# Altium integrated library LEMO Unipole And Multipole Type Connectors.IntLib: 1566 symbols (part 7 of 13) (continued)
## PKA.M0.4GL.VB
designator J?
Fixed receptacle with two nuts (back panel mounting), 90° print contacts, Key (A), P series, Multipole Type with 4 Contacts; Manufacturer: LEMO; PartNumber: PKA.M0.4GL.VB; Number of contacts: 4; Contact Diameter: 0.9 mm; Test voltage (kV rms) Contact-Contact: 1.2; Rated Current(A): 8; DatasheetVersion: Jun-14; PackageReference: PKA.M0.4GL.VB; PackageDescription: Fixed receptacle with two nuts (back panel mounting), 90° print contacts, Key(A) for Printed Circuit; ComponentLink1Description: Manufacturer URL; ComponentLink1URL: http://www.lemo.com; ComponentLink2Description: Datasheet; ComponentLink2URL: http://intra.lemo.ch/catalog/ROW/UK_English/P_series_catalog.pdf
footprint PKA.M0.4GL.VB (Socket, Female, Height 33.5 mm, Through hole)
pins: 1, 2, 3, 4

## PKA.M0.4GL.VG
designator J?
Fixed receptacle with two nuts (back panel mounting), 90° print contacts, Key (A), P series, Multipole Type with 4 Contacts; Manufacturer: LEMO; PartNumber: PKA.M0.4GL.VG; Number of contacts: 4; Contact Diameter: 0.9 mm; Test voltage (kV rms) Contact-Contact: 1.2; Rated Current(A): 8; DatasheetVersion: Jun-14; PackageReference: PKA.M0.4GL.VG; PackageDescription: Fixed receptacle with two nuts (back panel mounting), 90° print contacts, Key(A) for Printed Circuit; ComponentLink1Description: Manufacturer URL; ComponentLink1URL: http://www.lemo.com; ComponentLink2Description: Datasheet; ComponentLink2URL: http://intra.lemo.ch/catalog/ROW/UK_English/P_series_catalog.pdf
footprint PKA.M0.4GL.VG (Socket, Female, Height 33.5 mm, Through hole)
pins: 1, 2, 3, 4

## PKA.M0.4GL.VJ
designator J?
Fixed receptacle with two nuts (back panel mounting), 90° print contacts, Key (A), P series, Multipole Type with 4 Contacts; Manufacturer: LEMO; PartNumber: PKA.M0.4GL.VJ; Number of contacts: 4; Contact Diameter: 0.9 mm; Test voltage (kV rms) Contact-Contact: 1.2; Rated Current(A): 8; DatasheetVersion: Jun-14; PackageReference: PKA.M0.4GL.VJ; PackageDescription: Fixed receptacle with two nuts (back panel mounting), 90° print contacts, Key(A) for Printed Circuit; ComponentLink1Description: Manufacturer URL; ComponentLink1URL: http://www.lemo.com; ComponentLink2Description: Datasheet; ComponentLink2URL: http://intra.lemo.ch/catalog/ROW/UK_English/P_series_catalog.pdf
footprint PKA.M0.4GL.VJ (Socket, Female, Height 33.5 mm, Through hole)
pins: 1, 2, 3, 4

## PKA.M0.4GL.VN
designator J?
Fixed receptacle with two nuts (back panel mounting), 90° print contacts, Key (A),  series, Multipole Type with 4 Contacts; Manufacturer: LEMO; PartNumber: PKA.M0.4GL.VN; Number of contacts: 4; Contact Diameter: 0.9 mm; Test voltage (kV rms) Contact-Contact: 1.2; Rated Current(A): 8; DatasheetVersion: Jun-14; PackageReference: PKA.M0.4GL.VN; PackageDescription: Fixed receptacle with two nuts (back panel mounting), 90° print contacts, Key(A) for Printed Circuit; ComponentLink1Description: Manufacturer URL; ComponentLink1URL: http://www.lemo.com; ComponentLink2Description: Datasheet; ComponentLink2URL: http://intra.lemo.ch/catalog/ROW/UK_English/P_series_catalog.pdf
footprint PKA.M0.4GL.VN (Socket, Female, Height 33.5 mm, Through hole)
pins: 1, 2, 3, 4

## PKA.M0.4GL.VR
designator J?
Fixed receptacle with two nuts (back panel mounting), 90° print contacts, Key (A), P series, Multipole Type with 4 Contacts; Manufacturer: LEMO; PartNumber: PKA.M0.4GL.VR; Number of contacts: 4; Contact Diameter: 0.9 mm; Test voltage (kV rms) Contact-Contact: 1.2; Rated Current(A): 8; DatasheetVersion: Jun-14; PackageReference: PKA.M0.4GL.VR; PackageDescription: Fixed receptacle with two nuts (back panel mounting), 90° print contacts, Key(A) for Printed Circuit; ComponentLink1Description: Manufacturer URL; ComponentLink1URL: http://www.lemo.com; ComponentLink2Description: Datasheet; ComponentLink2URL: http://intra.lemo.ch/catalog/ROW/UK_English/P_series_catalog.pdf
footprint PKA.M0.4GL.VR (Socket, Female, Height 33.5 mm, Through hole)
pins: 1, 2, 3, 4

## PKA.M0.4GL.VV
designator J?
Fixed receptacle with two nuts (back panel mounting), 90° print contacts, Key (A), P series, Multipole Type with 4 Contacts; Manufacturer: LEMO; PartNumber: PKA.M0.4GL.VV; Number of contacts: 4; Contact Diameter: 0.9 mm; Test voltage (kV rms) Contact-Contact: 1.2; Rated Current(A): 8; DatasheetVersion: Jun-14; PackageReference: PKA.M0.4GL.VV; PackageDescription: Fixed receptacle with two nuts (back panel mounting), 90° print contacts, Key(A) for Printed Circuit; ComponentLink1Description: Manufacturer URL; ComponentLink1URL: http://www.lemo.com; ComponentLink2Description: Datasheet; ComponentLink2URL: http://intra.lemo.ch/catalog/ROW/UK_English/P_series_catalog.pdf
footprint PKA.M0.4GL.VV (Socket, Female, Height 33.5 mm, Through hole)
pins: 1, 2, 3, 4

## PKA.M0.4GL.VZ
designator J?
Fixed receptacle with 1 nut (without 2nd front nut), Key (A), P series, Multipole Type with 4 Contacts; Manufacturer: LEMO; PartNumber: PKA.M0.4GL.VZ; Number of contacts: 4; Contact Diameter: 0.9 mm; Test voltage (kV rms) Contact-Contact: 1.2; Rated Current(A): 8; DatasheetVersion: Jun-14; PackageReference: PKA.M0.4GL.VZ; PackageDescription: Fixed receptacle with 1 nut (without 2nd front nut), Key(A) for Printed Circuit; ComponentLink1Description: Manufacturer URL; ComponentLink1URL: http://www.lemo.com; ComponentLink2Description: Datasheet; ComponentLink2URL: http://intra.lemo.ch/catalog/ROW/UK_English/P_series_catalog.pdf
footprint PKA.M0.4GL.VZ (Socket, Female, Height 33.5 mm, Through hole)
pins: 1, 2, 3, 4

## PKA.M0.4NL.NN
designator J?
Fixed receptacle with two nuts (back panel mounting), straight print contacts, Key (A), P series, Multipole Type with 4 Contacts; Manufacturer: LEMO; PartNumber: PKA.M0.4NL.NN; Number of contacts: 4; Contact Diameter: 0.9 mm; Test voltage (kV rms) Contact-Contact: 1.2; Rated Current(A): 8; DatasheetVersion: Jun-14; PackageReference: PKA.M0.4NL.NN; PackageDescription: Fixed receptacle with two nuts (back panel mounting), straight print contacts, Key(A) for Printed Circuit; ComponentLink1Description: Manufacturer URL; ComponentLink1URL: http://www.lemo.com; ComponentLink2Description: Datasheet; ComponentLink2URL: http://intra.lemo.ch/catalog/ROW/UK_English/P_series_catalog.pdf
footprint PKA.M0.4NL.NN (Socket, Female, Height 33.5 mm, Through hole)
pins: 1, 2, 3, 4

## PKA.M0.4NL.NV
designator J?
Fixed receptacle with two nuts (back panel mounting), straight print contacts, Key (A), P series, Multipole Type with 4 Contacts; Manufacturer: LEMO; PartNumber: PKA.M0.4NL.NV; Number of contacts: 4; Contact Diameter: 0.9 mm; Test voltage (kV rms) Contact-Contact: 1.2; Rated Current(A): 8; DatasheetVersion: Jun-14; PackageReference: PKA.M0.4NL.NV; PackageDescription: Fixed receptacle with two nuts (back panel mounting), straight print contacts, Key(A) for Printed Circuit; ComponentLink1Description: Manufacturer URL; ComponentLink1URL: http://www.lemo.com; ComponentLink2Description: Datasheet; ComponentLink2URL: http://intra.lemo.ch/catalog/ROW/UK_English/P_series_catalog.pdf
footprint PKA.M0.4NL.NV (Socket, Female, Height 33.5 mm, Through hole)
pins: 1, 2, 3, 4

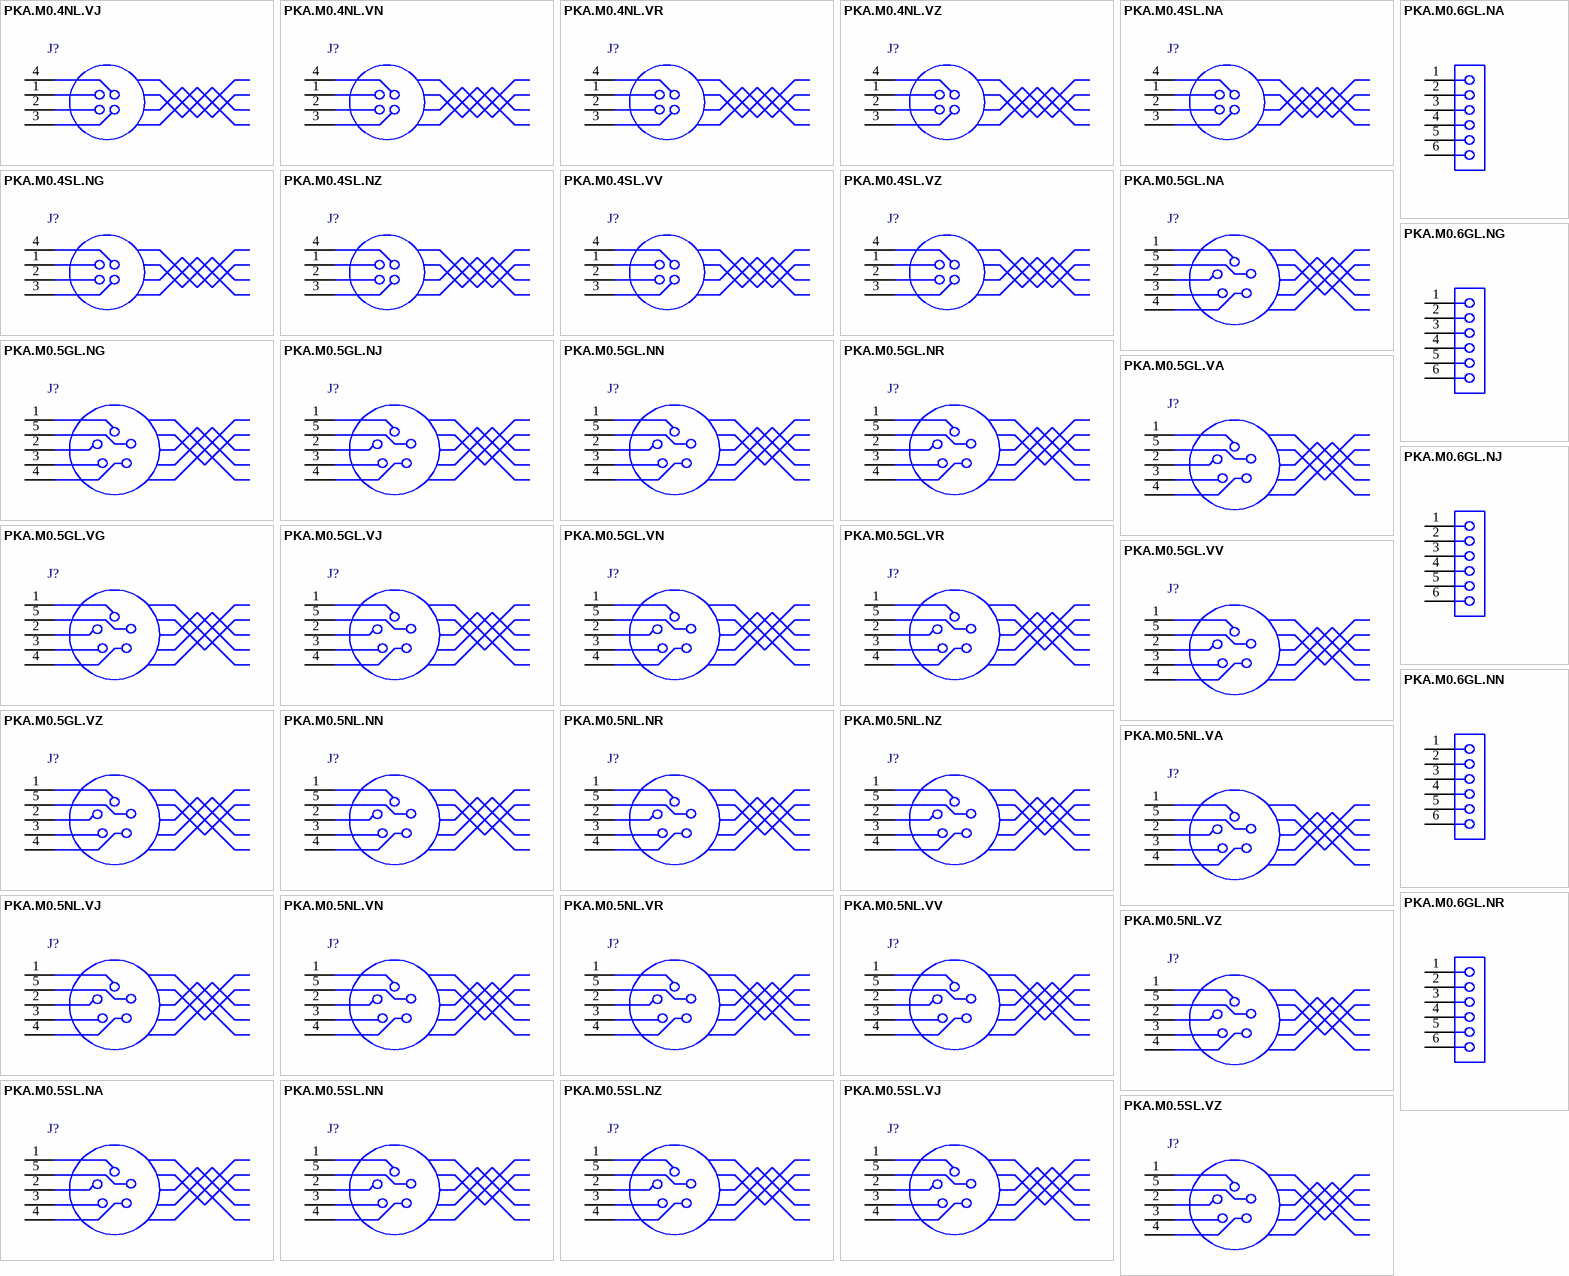
[diagram p24: symbols PKA.M0.4NL.VJ to PKA.M0.6GL.NR]

## PKA.M0.4NL.VJ
designator J?
Fixed receptacle with two nuts (back panel mounting), 90° print contacts, Key (A), P series, Multipole Type with 4 Contacts; Manufacturer: LEMO; PartNumber: PKA.M0.4NL.VJ; Number of contacts: 4; Contact Diameter: 0.9 mm; Test voltage (kV rms) Contact-Contact: 1.2; Rated Current(A): 8; DatasheetVersion: Jun-14; PackageReference: PKA.M0.4NL.VJ; PackageDescription: Fixed receptacle with two nuts (back panel mounting), 90° print contacts, Key(A) for Printed Circuit; ComponentLink1Description: Manufacturer URL; ComponentLink1URL: http://www.lemo.com; ComponentLink2Description: Datasheet; ComponentLink2URL: http://intra.lemo.ch/catalog/ROW/UK_English/P_series_catalog.pdf
footprint PKA.M0.4NL.VJ (Socket, Female, Height 33.5 mm, Through hole)
pins: 1, 2, 3, 4

## PKA.M0.4NL.VN
designator J?
Fixed receptacle with two nuts (back panel mounting), 90° print contacts, Key (A), P series, Multipole Type with 4 Contacts; Manufacturer: LEMO; PartNumber: PKA.M0.4NL.VN; Number of contacts: 4; Contact Diameter: 0.9 mm; Test voltage (kV rms) Contact-Contact: 1.2; Rated Current(A): 8; DatasheetVersion: Jun-14; PackageReference: PKA.M0.4NL.VN; PackageDescription: Fixed receptacle with two nuts (back panel mounting), 90° print contacts, Key(A) for Printed Circuit; ComponentLink1Description: Manufacturer URL; ComponentLink1URL: http://www.lemo.com; ComponentLink2Description: Datasheet; ComponentLink2URL: http://intra.lemo.ch/catalog/ROW/UK_English/P_series_catalog.pdf
footprint PKA.M0.4NL.VN (Socket, Female, Height 33.5 mm, Through hole)
pins: 1, 2, 3, 4

## PKA.M0.4NL.VR
designator J?
Fixed receptacle with two nuts (back panel mounting), 90° print contacts, Key (A), P series, Multipole Type with 4 Contacts; Manufacturer: LEMO; PartNumber: PKA.M0.4NL.VR; Number of contacts: 4; Contact Diameter: 0.9 mm; Test voltage (kV rms) Contact-Contact: 1.2; Rated Current(A): 8; DatasheetVersion: Jun-14; PackageReference: PKA.M0.4NL.VR; PackageDescription: Fixed receptacle with two nuts (back panel mounting), 90° print contacts, Key(A) for Printed Circuit; ComponentLink1Description: Manufacturer URL; ComponentLink1URL: http://www.lemo.com; ComponentLink2Description: Datasheet; ComponentLink2URL: http://intra.lemo.ch/catalog/ROW/UK_English/P_series_catalog.pdf
footprint PKA.M0.4NL.VR (Socket, Female, Height 33.5 mm, Through hole)
pins: 1, 2, 3, 4

## PKA.M0.4NL.VZ
designator J?
Fixed receptacle with 1 nut (without 2nd front nut), Key (A), P series, Multipole Type with 4 Contacts; Manufacturer: LEMO; PartNumber: PKA.M0.4NL.VZ; Number of contacts: 4; Contact Diameter: 0.9 mm; Test voltage (kV rms) Contact-Contact: 1.2; Rated Current(A): 8; DatasheetVersion: Jun-14; PackageReference: PKA.M0.4NL.VZ; PackageDescription: Fixed receptacle with 1 nut (without 2nd front nut), Key(A) for Printed Circuit; ComponentLink1Description: Manufacturer URL; ComponentLink1URL: http://www.lemo.com; ComponentLink2Description: Datasheet; ComponentLink2URL: http://intra.lemo.ch/catalog/ROW/UK_English/P_series_catalog.pdf
footprint PKA.M0.4NL.VZ (Socket, Female, Height 33.5 mm, Through hole)
pins: 1, 2, 3, 4

## PKA.M0.4SL.NA
designator J?
Fixed receptacle with two nuts (back panel mounting), straight print contacts, Key (A), P series, Multipole Type with 4 Contacts; Manufacturer: LEMO; PartNumber: PKA.M0.4SL.NA; Number of contacts: 4; Contact Diameter: 0.9 mm; Test voltage (kV rms) Contact-Contact: 1.2; Rated Current(A): 8; DatasheetVersion: Jun-14; PackageReference: PKA.M0.4SL.NA; PackageDescription: Fixed receptacle with two nuts (back panel mounting), straight print contacts, Key(A) for Printed Circuit; Supplier 1: Mouser; Supplier Part Number 1: 736-PKA.M0.4SL.NA; Supplier 2: Digi-Key; Supplier Part Number 2: PKA.M0.4SL.NA-ND; ComponentLink1Description: Manufacturer URL; ComponentLink1URL: http://www.lemo.com; ComponentLink2Description: Datasheet; ComponentLink2URL: http://intra.lemo.ch/catalog/ROW/UK_English/P_series_catalog.pdf
footprint PKA.M0.4SL.NA (Socket, Female, Height 33.5 mm, Through hole)
pins: 1, 2, 3, 4

## PKA.M0.4SL.NG
designator J?
Fixed receptacle with two nuts (back panel mounting), straight print contacts, Key (A), P series, Multipole Type with 4 Contacts; Manufacturer: LEMO; PartNumber: PKA.M0.4SL.NG; Number of contacts: 4; Contact Diameter: 0.9 mm; Test voltage (kV rms) Contact-Contact: 1.2; Rated Current(A): 8; DatasheetVersion: Jun-14; PackageReference: PKA.M0.4SL.NG; PackageDescription: Fixed receptacle with two nuts (back panel mounting), straight print contacts, Key(A) for Printed Circuit; Supplier 1: Mouser; Supplier Part Number 1: 736-PKAM04SLNG; Supplier 2: Digi-Key; Supplier Part Number 2: PKA.M0.4SL.NG-ND; ComponentLink1Description: Manufacturer URL; ComponentLink1URL: http://www.lemo.com; ComponentLink2Description: Datasheet; ComponentLink2URL: http://intra.lemo.ch/catalog/ROW/UK_English/P_series_catalog.pdf
footprint PKA.M0.4SL.NG (Socket, Female, Height 33.5 mm, Through hole)
pins: 1, 2, 3, 4

## PKA.M0.4SL.NZ
designator J?
Fixed receptacle with 1 nut (without 2nd front nut), Key (A), P series, Multipole Type with 4 Contacts; Manufacturer: LEMO; PartNumber: PKA.M0.4SL.NZ; Number of contacts: 4; Contact Diameter: 0.9 mm; Test voltage (kV rms) Contact-Contact: 1.2; Rated Current(A): 8; DatasheetVersion: Jun-14; PackageReference: PKA.M0.4SL.NZ; PackageDescription: Fixed receptacle with 1 nut (without 2nd front nut), Key(A) for Printed Circuit; Supplier 1: Mouser; Supplier Part Number 1: 736-PKAM04SLNZ; Supplier 2: Digi-Key; Supplier Part Number 2: PKA.M0.4SL.NZ-ND; ComponentLink1Description: Manufacturer URL; ComponentLink1URL: http://www.lemo.com; ComponentLink2Description: Datasheet; ComponentLink2URL: http://intra.lemo.ch/catalog/ROW/UK_English/P_series_catalog.pdf
footprint PKA.M0.4SL.NZ (Socket, Female, Height 25 mm, Through hole)
pins: 1, 2, 3, 4

## PKA.M0.4SL.VV
designator J?
Fixed receptacle with two nuts (back panel mounting), 90° print contacts, Key (A),  series, Multipole Type with 4 Contacts; Manufacturer: LEMO; PartNumber: PKA.M0.4SL.VV; Number of contacts: 4; Contact Diameter: 0.9 mm; Test voltage (kV rms) Contact-Contact: 1.2; Rated Current(A): 8; DatasheetVersion: Jun-14; PackageReference: PKA.M0.4SL.VV; PackageDescription: Fixed receptacle with two nuts (back panel mounting), 90° print contacts, Key(A) for Printed Circuit; Supplier 1: Mouser; Supplier Part Number 1: 736-PKAM04SLVV; Supplier 2: Digi-Key; Supplier Part Number 2: PKA.M0.4SL.VV-ND; ComponentLink1Description: Manufacturer URL; ComponentLink1URL: http://www.lemo.com; ComponentLink2Description: Datasheet; ComponentLink2URL: http://intra.lemo.ch/catalog/ROW/UK_English/P_series_catalog.pdf
footprint PKA.M0.4SL.VV (Socket, Female, Height 33.5 mm, Through hole)
pins: 1, 2, 3, 4

## PKA.M0.4SL.VZ
designator J?
Fixed receptacle with 1 nut (without 2nd front nut), Key (A), P series, Multipole Type with 4 Contacts; Manufacturer: LEMO; PartNumber: PKA.M0.4SL.VZ; Number of contacts: 4; Contact Diameter: 0.9 mm; Test voltage (kV rms) Contact-Contact: 1.2; Rated Current(A): 8; DatasheetVersion: Jun-14; PackageReference: PKA.M0.4SL.VZ; PackageDescription: Fixed receptacle with 1 nut (without 2nd front nut), Key(A) for Printed Circuit; Supplier 1: Mouser; Supplier Part Number 1: 736-PKAM04SLVZ; Supplier 2: Digi-Key; Supplier Part Number 2: PKA.M0.4SL.VZ-ND; ComponentLink1Description: Manufacturer URL; ComponentLink1URL: http://www.lemo.com; ComponentLink2Description: Datasheet; ComponentLink2URL: http://intra.lemo.ch/catalog/ROW/UK_English/P_series_catalog.pdf
footprint PKA.M0.4SL.VZ (Socket, Female, Height 33.5 mm, Through hole)
pins: 1, 2, 3, 4

## PKA.M0.5GL.NA
designator J?
Fixed receptacle with two nuts (back panel mounting), straight print contacts, Key (A), P series, Multipole Type with 5 Contacts; Manufacturer: LEMO; PartNumber: PKA.M0.5GL.NA; Number of contacts: 5; Contact Diameter: 0.9 mm; Test voltage (kV rms) Contact-Contact: 1.05; Rated Current(A): 7; DatasheetVersion: Jun-14; PackageReference: PKA.M0.5GL.NA; PackageDescription: Fixed receptacle with two nuts (back panel mounting), straight print contacts, Key(A) for Printed Circuit; Supplier 1: Mouser; Supplier Part Number 1: 736-PKAM05GLNA; Supplier 2: Digi-Key; Supplier Part Number 2: PKA.M0.5GL.NA-ND; ComponentLink1Description: Manufacturer URL; ComponentLink1URL: http://www.lemo.com; ComponentLink2Description: Datasheet; ComponentLink2URL: http://intra.lemo.ch/catalog/ROW/UK_English/P_series_catalog.pdf
footprint PKA.M0.5GL.NA (Socket, Female, Height 33.5 mm, Through hole)
pins: 1, 2, 3, 4, 5

## PKA.M0.5GL.NG
designator J?
Fixed receptacle with two nuts (back panel mounting), straight print contacts, Key (A), P series, Multipole Type with 5 Contacts; Manufacturer: LEMO; PartNumber: PKA.M0.5GL.NG; Number of contacts: 5; Contact Diameter: 0.9 mm; Test voltage (kV rms) Contact-Contact: 1.05; Rated Current(A): 7; DatasheetVersion: Jun-14; PackageReference: PKA.M0.5GL.NG; PackageDescription: Fixed receptacle with two nuts (back panel mounting), straight print contacts, Key(A) for Printed Circuit; ComponentLink1Description: Manufacturer URL; ComponentLink1URL: http://www.lemo.com; ComponentLink2Description: Datasheet; ComponentLink2URL: http://intra.lemo.ch/catalog/ROW/UK_English/P_series_catalog.pdf
footprint PKA.M0.5GL.NG (Socket, Female, Height 33.5 mm, Through hole)
pins: 1, 2, 3, 4, 5

## PKA.M0.5GL.NJ
designator J?
Fixed receptacle with two nuts (back panel mounting), straight print contacts, Key (A), P series, Multipole Type with 5 Contacts; Manufacturer: LEMO; PartNumber: PKA.M0.5GL.NJ; Number of contacts: 5; Contact Diameter: 0.9 mm; Test voltage (kV rms) Contact-Contact: 1.05; Rated Current(A): 7; DatasheetVersion: Jun-14; PackageReference: PKA.M0.5GL.NJ; PackageDescription: Fixed receptacle with two nuts (back panel mounting), straight print contacts, Key(A) for Printed Circuit; ComponentLink1Description: Manufacturer URL; ComponentLink1URL: http://www.lemo.com; ComponentLink2Description: Datasheet; ComponentLink2URL: http://intra.lemo.ch/catalog/ROW/UK_English/P_series_catalog.pdf
footprint PKA.M0.5GL.NJ (Socket, Female, Height 33.5 mm, Through hole)
pins: 1, 2, 3, 4, 5

## PKA.M0.5GL.NN
designator J?
Fixed receptacle with two nuts (back panel mounting), straight print contacts, Key (A), P series, Multipole Type with 5 Contacts; Manufacturer: LEMO; PartNumber: PKA.M0.5GL.NN; Number of contacts: 5; Contact Diameter: 0.9 mm; Test voltage (kV rms) Contact-Contact: 1.05; Rated Current(A): 7; DatasheetVersion: Jun-14; PackageReference: PKA.M0.5GL.NN; PackageDescription: Fixed receptacle with two nuts (back panel mounting), straight print contacts, Key(A) for Printed Circuit; ComponentLink1Description: Manufacturer URL; ComponentLink1URL: http://www.lemo.com; ComponentLink2Description: Datasheet; ComponentLink2URL: http://intra.lemo.ch/catalog/ROW/UK_English/P_series_catalog.pdf
footprint PKA.M0.5GL.NN (Socket, Female, Height 33.5 mm, Through hole)
pins: 1, 2, 3, 4, 5

## PKA.M0.5GL.NR
designator J?
Fixed receptacle with two nuts (back panel mounting), straight print contacts, Key (A), P series, Multipole Type with 5 Contacts; Manufacturer: LEMO; PartNumber: PKA.M0.5GL.NR; Number of contacts: 5; Contact Diameter: 0.9 mm; Test voltage (kV rms) Contact-Contact: 1.05; Rated Current(A): 7; DatasheetVersion: Jun-14; PackageReference: PKA.M0.5GL.NR; PackageDescription: Fixed receptacle with two nuts (back panel mounting), straight print contacts, Key(A) for Printed Circuit; ComponentLink1Description: Manufacturer URL; ComponentLink1URL: http://www.lemo.com; ComponentLink2Description: Datasheet; ComponentLink2URL: http://intra.lemo.ch/catalog/ROW/UK_English/P_series_catalog.pdf
footprint PKA.M0.5GL.NR (Socket, Female, Height 33.5 mm, Through hole)
pins: 1, 2, 3, 4, 5

## PKA.M0.5GL.VA
designator J?
Fixed receptacle with two nuts (back panel mounting), 90° print contacts, Key (A), P series, Multipole Type with 5 Contacts; Manufacturer: LEMO; PartNumber: PKA.M0.5GL.VA; Number of contacts: 5; Contact Diameter: 0.9 mm; Test voltage (kV rms) Contact-Contact: 1.05; Rated Current(A): 7; DatasheetVersion: Jun-14; PackageReference: PKA.M0.5GL.VA; PackageDescription: Fixed receptacle with two nuts (back panel mounting), 90° print contacts, Key(A) for Printed Circuit; ComponentLink1Description: Manufacturer URL; ComponentLink1URL: http://www.lemo.com; ComponentLink2Description: Datasheet; ComponentLink2URL: http://intra.lemo.ch/catalog/ROW/UK_English/P_series_catalog.pdf
footprint PKA.M0.5GL.VA (Socket, Female, Height 33.5 mm, Through hole)
pins: 1, 2, 3, 4, 5

## PKA.M0.5GL.VG
designator J?
Fixed receptacle with two nuts (back panel mounting), 90° print contacts, Key (A), P series, Multipole Type with 5 Contacts; Manufacturer: LEMO; PartNumber: PKA.M0.5GL.VG; Number of contacts: 5; Contact Diameter: 0.9 mm; Test voltage (kV rms) Contact-Contact: 1.05; Rated Current(A): 7; DatasheetVersion: Jun-14; PackageReference: PKA.M0.5GL.VG; PackageDescription: Fixed receptacle with two nuts (back panel mounting), 90° print contacts, Key(A) for Printed Circuit; ComponentLink1Description: Manufacturer URL; ComponentLink1URL: http://www.lemo.com; ComponentLink2Description: Datasheet; ComponentLink2URL: http://intra.lemo.ch/catalog/ROW/UK_English/P_series_catalog.pdf
footprint PKA.M0.5GL.VG (Socket, Female, Height 33.5 mm, Through hole)
pins: 1, 2, 3, 4, 5

## PKA.M0.5GL.VJ
designator J?
Fixed receptacle with two nuts (back panel mounting), 90° print contacts, Key (A), P series, Multipole Type with 5 Contacts; Manufacturer: LEMO; PartNumber: PKA.M0.5GL.VJ; Number of contacts: 5; Contact Diameter: 0.9 mm; Test voltage (kV rms) Contact-Contact: 1.05; Rated Current(A): 7; DatasheetVersion: Jun-14; PackageReference: PKA.M0.5GL.VJ; PackageDescription: Fixed receptacle with two nuts (back panel mounting), 90° print contacts, Key(A) for Printed Circuit; ComponentLink1Description: Manufacturer URL; ComponentLink1URL: http://www.lemo.com; ComponentLink2Description: Datasheet; ComponentLink2URL: http://intra.lemo.ch/catalog/ROW/UK_English/P_series_catalog.pdf
footprint PKA.M0.5GL.VJ (Socket, Female, Height 33.5 mm, Through hole)
pins: 1, 2, 3, 4, 5

## PKA.M0.5GL.VN
designator J?
Fixed receptacle with two nuts (back panel mounting), 90° print contacts, Key (A), P series, Multipole Type with 5 Contacts; Manufacturer: LEMO; PartNumber: PKA.M0.5GL.VN; Number of contacts: 5; Contact Diameter: 0.9 mm; Test voltage (kV rms) Contact-Contact: 1.05; Rated Current(A): 7; DatasheetVersion: Jun-14; PackageReference: PKA.M0.5GL.VN; PackageDescription: Fixed receptacle with two nuts (back panel mounting), 90° print contacts, Key(A) for Printed Circuit; ComponentLink1Description: Manufacturer URL; ComponentLink1URL: http://www.lemo.com; ComponentLink2Description: Datasheet; ComponentLink2URL: http://intra.lemo.ch/catalog/ROW/UK_English/P_series_catalog.pdf
footprint PKA.M0.5GL.VN (Socket, Female, Height 33.5 mm, Through hole)
pins: 1, 2, 3, 4, 5

## PKA.M0.5GL.VR
designator J?
Fixed receptacle with two nuts (back panel mounting), 90° print contacts, Key (A), P series, Multipole Type with 5 Contacts; Manufacturer: LEMO; PartNumber: PKA.M0.5GL.VR; Number of contacts: 5; Contact Diameter: 0.9 mm; Test voltage (kV rms) Contact-Contact: 1.05; Rated Current(A): 7; DatasheetVersion: Jun-14; PackageReference: PKA.M0.5GL.VR; PackageDescription: Fixed receptacle with two nuts (back panel mounting), 90° print contacts, Key(A) for Printed Circuit; ComponentLink1Description: Manufacturer URL; ComponentLink1URL: http://www.lemo.com; ComponentLink2Description: Datasheet; ComponentLink2URL: http://intra.lemo.ch/catalog/ROW/UK_English/P_series_catalog.pdf
footprint PKA.M0.5GL.VR (Socket, Female, Height 33.5 mm, Through hole)
pins: 1, 2, 3, 4, 5

## PKA.M0.5GL.VV
designator J?
Fixed receptacle with two nuts (back panel mounting), 90° print contacts, Key (A), P series, Multipole Type with 5 Contacts; Manufacturer: LEMO; PartNumber: PKA.M0.5GL.VV; Number of contacts: 5; Contact Diameter: 0.9 mm; Test voltage (kV rms) Contact-Contact: 1.05; Rated Current(A): 7; DatasheetVersion: Jun-14; PackageReference: PKA.M0.5GL.VV; PackageDescription: Fixed receptacle with two nuts (back panel mounting), 90° print contacts, Key(A) for Printed Circuit; ComponentLink1Description: Manufacturer URL; ComponentLink1URL: http://www.lemo.com; ComponentLink2Description: Datasheet; ComponentLink2URL: http://intra.lemo.ch/catalog/ROW/UK_English/P_series_catalog.pdf
footprint PKA.M0.5GL.VV (Socket, Female, Height 33.5 mm, Through hole)
pins: 1, 2, 3, 4, 5

## PKA.M0.5GL.VZ
designator J?
Fixed receptacle with 1 nut (without 2nd front nut), Key (A), P series, Multipole Type with 5 Contacts; Manufacturer: LEMO; PartNumber: PKA.M0.5GL.VZ; Number of contacts: 5; Contact Diameter: 0.9 mm; Test voltage (kV rms) Contact-Contact: 1.05; Rated Current(A): 7; DatasheetVersion: Jun-14; PackageReference: PKA.M0.5GL.VZ; PackageDescription: Fixed receptacle with 1 nut (without 2nd front nut), Key(A) for Printed Circuit; ComponentLink1Description: Manufacturer URL; ComponentLink1URL: http://www.lemo.com; ComponentLink2Description: Datasheet; ComponentLink2URL: http://intra.lemo.ch/catalog/ROW/UK_English/P_series_catalog.pdf
footprint PKA.M0.5GL.VZ (Socket, Female, Height 33.5 mm, Through hole)
pins: 1, 2, 3, 4, 5

## PKA.M0.5NL.NN
designator J?
Fixed receptacle with two nuts (back panel mounting), straight print contacts, Key (A), P series, Multipole Type with 5 Contacts; Manufacturer: LEMO; PartNumber: PKA.M0.5NL.NN; Number of contacts: 5; Contact Diameter: 0.9 mm; Test voltage (kV rms) Contact-Contact: 1.05; Rated Current(A): 7; DatasheetVersion: Jun-14; PackageReference: PKA.M0.5NL.NN; PackageDescription: Fixed receptacle with two nuts (back panel mounting), straight print contacts, Key(A) for Printed Circuit; ComponentLink1Description: Manufacturer URL; ComponentLink1URL: http://www.lemo.com; ComponentLink2Description: Datasheet; ComponentLink2URL: http://intra.lemo.ch/catalog/ROW/UK_English/P_series_catalog.pdf
footprint PKA.M0.5NL.NN (Socket, Female, Height 33.5 mm, Through hole)
pins: 1, 2, 3, 4, 5

## PKA.M0.5NL.NR
designator J?
Fixed receptacle with two nuts (back panel mounting), straight print contacts, Key (A), P series, Multipole Type with 5 Contacts; Manufacturer: LEMO; PartNumber: PKA.M0.5NL.NR; Number of contacts: 5; Contact Diameter: 0.9 mm; Test voltage (kV rms) Contact-Contact: 1.05; Rated Current(A): 7; DatasheetVersion: Jun-14; PackageReference: PKA.M0.5NL.NR; PackageDescription: Fixed receptacle with two nuts (back panel mounting), straight print contacts, Key(A) for Printed Circuit; ComponentLink1Description: Manufacturer URL; ComponentLink1URL: http://www.lemo.com; ComponentLink2Description: Datasheet; ComponentLink2URL: http://intra.lemo.ch/catalog/ROW/UK_English/P_series_catalog.pdf
footprint PKA.M0.5NL.NR (Socket, Female, Height 33.5 mm, Through hole)
pins: 1, 2, 3, 4, 5

## PKA.M0.5NL.NZ
designator J?
Fixed receptacle with 1 nut (without 2nd front nut), Key (A), P series, Multipole Type with 5 Contacts; Manufacturer: LEMO; PartNumber: PKA.M0.5NL.NZ; Number of contacts: 5; Contact Diameter: 0.9 mm; Test voltage (kV rms) Contact-Contact: 1.05; Rated Current(A): 7; DatasheetVersion: Jun-14; PackageReference: PKA.M0.5NL.NZ; PackageDescription: Fixed receptacle with 1 nut (without 2nd front nut), Key(A) for Printed Circuit; ComponentLink1Description: Manufacturer URL; ComponentLink1URL: http://www.lemo.com; ComponentLink2Description: Datasheet; ComponentLink2URL: http://intra.lemo.ch/catalog/ROW/UK_English/P_series_catalog.pdf
footprint PKA.M0.5NL.NZ (Socket, Female, Height 25 mm, Through hole)
pins: 1, 2, 3, 4, 5

## PKA.M0.5NL.VA
designator J?
Fixed receptacle with two nuts (back panel mounting), 90° print contacts, Key (A), P series, Multipole Type with 5 Contacts; Manufacturer: LEMO; PartNumber: PKA.M0.5NL.VA; Number of contacts: 5; Contact Diameter: 0.9 mm; Test voltage (kV rms) Contact-Contact: 1.05; Rated Current(A): 7; DatasheetVersion: Jun-14; PackageReference: PKA.M0.5NL.VA; PackageDescription: Fixed receptacle with two nuts (back panel mounting), 90° print contacts, Key(A) for Printed Circuit; ComponentLink1Description: Manufacturer URL; ComponentLink1URL: http://www.lemo.com; ComponentLink2Description: Datasheet; ComponentLink2URL: http://intra.lemo.ch/catalog/ROW/UK_English/P_series_catalog.pdf
footprint PKA.M0.5NL.VA (Socket, Female, Height 33.5 mm, Through hole)
pins: 1, 2, 3, 4, 5

## PKA.M0.5NL.VJ
designator J?
Fixed receptacle with two nuts (back panel mounting), 90° print contacts, Key (A), P series, Multipole Type with 5 Contacts; Manufacturer: LEMO; PartNumber: PKA.M0.5NL.VJ; Number of contacts: 5; Contact Diameter: 0.9 mm; Test voltage (kV rms) Contact-Contact: 1.05; Rated Current(A): 7; DatasheetVersion: Jun-14; PackageReference: PKA.M0.5NL.VJ; PackageDescription: Fixed receptacle with two nuts (back panel mounting), 90° print contacts, Key(A) for Printed Circuit; ComponentLink1Description: Manufacturer URL; ComponentLink1URL: http://www.lemo.com; ComponentLink2Description: Datasheet; ComponentLink2URL: http://intra.lemo.ch/catalog/ROW/UK_English/P_series_catalog.pdf
footprint PKA.M0.5NL.VJ (Socket, Female, Height 33.5 mm, Through hole)
pins: 1, 2, 3, 4, 5